# Altium footprint library MORNSUN.PcbLib: 2 footprints
Each footprint in its own frame and in the unit in brackets; x right, y up, seen from the top. Pads: shape width x height; smd on the part's side, far side on the other; paste and mask are expansions set on the pad; w line width, h text height; cw(c..) or ccw(c..) is an arc to the next point about the centre after c.
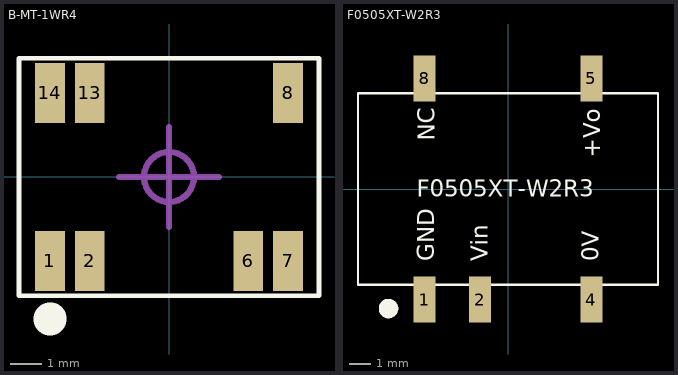
[diagram p0: the footprints below, top view; thin cyan lines are the x and y axes]

## B-MT-1WR4 [mm]
pads (7):
  rect 0.95x1.925 smd paste+0 mask-0.075: 1(-3.81,-2.686) 2(-2.54,-2.686) 6(2.54,-2.686) 7(3.81,-2.686) 8(3.81,2.686) 13(-2.54,2.686) 14(-3.81,2.686)
Top Overlay:
  circle w1: c-3.806,-4.543 r0.028
  lines w0.152: -4.8,-3.801 -4.8,3.799 4.8,3.799 4.8,-3.801 -4.8,-3.801
Mechanical 15:
  circle w0.2: c0,0 r0.8
  lines w0.2: -1.6,0 1.6,0 ; 0,-1.6 0,1.6
3D body "B0505MT-1WR4.STEP": height 3.1, standoff -0.01, extent -4.5,-3.449 4.5,3.555

## F0505XT-W2R3 [mm]
pads (5):
  rect 1x2.1 smd: 1(-3.81,-5.05) 2(-1.27,-5.05) 4(3.81,-5.05) 5(3.81,5.05) 8(-3.81,5.05)
Top Overlay:
  circle w0.5: c-5.456,-5.459 r0.196
  lines w0.1: -6.85,-4.375 6.85,-4.375 6.85,4.375 -6.85,4.375 -6.85,-4.375
  text "GND" at -3.367,-3.304 h0.76
  text "Vin" at -0.916,-3.304 h0.76
  text "0V" at 4.138,-3.304 h0.76
  text "+Vo" at 4.223,1.434 h0.76
  text "NC" at -3.344,2.199 h0.76
  text "F0505XT-W2R3" at -4.171,-0.36 h0.76
3D body "F0505XT-W2R3.stp": height 7.29, standoff 0.04, extent -6.6,-5.7 6.6,5.7